# Altium integrated library Weidmueller_OMNIMATE_Signal.IntLib: 2550 symbols (part 13 of 45)
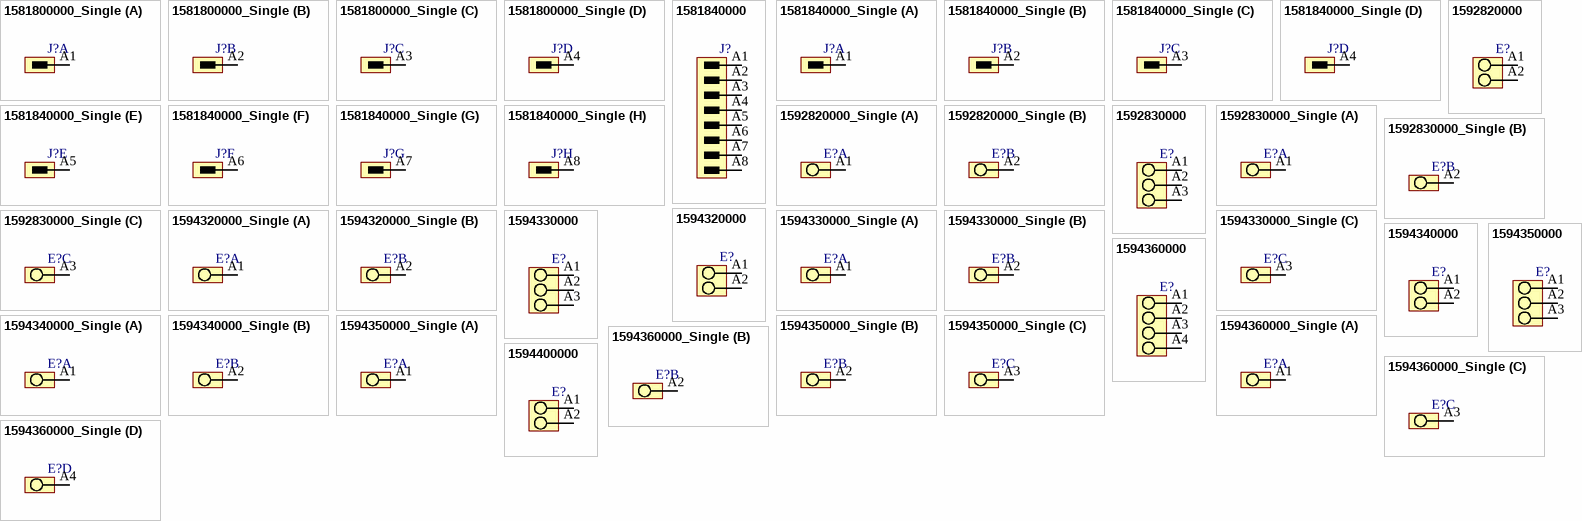
[diagram p223: symbols 1581800000_Single to 1594400000]

## 1594330000_Single
designator E?
OMNIMATE Signal - series LP; PartNumber: 1594330000; Manufacturer: Weidmueller; Short_text_for_material: LP 5.00/03/90 3.2SN OR BX; Side_termination_characteristic: closed side; Mounting_onto_the_PCB: Solder connection; Pitch_mm: 5 mm; Pitch_inch: 0,197 inch; No_of_poles: 3; Solder_pin_length_mm: 3,2 mm; Contact_material: Cu-Leg; Contact_surface: tinned; Insulating_material: PA; UL_94_flammability_rating: V-2; Rated_voltage_for_surge_voltage_class_pollution_degree_II_2: 500 V; Rated_current_min_no_of_poles_TU_20_deg_C: 32 A; Solid_min_H05_07_V_U: 0,5 mm²; Solid_max_H05_07_V_U: 6 mm²; Rated_voltage_use_group_B_UL_1059: 300 V; Rated_current_use_group_B_UL_1059: 20 A; Wire_cross_section_AWG_min_UL_1059: AWG 26; Wire_cross_section_AWG_max_UL_1059: AWG 12; PackageReference: LP_5_00_90_03; Colour: Orange; Packaging: Box; Qty: 100 PCS; Revision: V1; ComponentLink1Description: Manufacturer URL; ComponentLink1URL: http://www.weidmueller.com/; ComponentLink2Description: URL Link1; ComponentLink2URL: http://catalog.weidmueller.com/catalog/Start.do?localeId=en&ObjectID=1594330000
footprint LP_5_00_90_03 (OMNIMATE Signal - Serie LP  LP 5.00/03/90 3.2)
part A pins: A1
part B pins: A2
part C pins: A3
1 alternate drawing of the same symbol

## 1594340000
designator E?
OMNIMATE Signal - series LP; PartNumber: 1594340000; Manufacturer: Weidmueller; Short_text_for_material: LPP 5.00/02/90 3.2SN OR BX; Side_termination_characteristic: closed side; Mounting_onto_the_PCB: Solder connection; Pitch_mm: 5 mm; Pitch_inch: 0,197 inch; No_of_poles: 2; Solder_pin_length_mm: 3,2 mm; Contact_material: Cu-Leg; Contact_surface: tinned; Insulating_material: PA; UL_94_flammability_rating: V-2; Rated_voltage_for_surge_voltage_class_pollution_degree_II_2: 500 V; Rated_current_min_no_of_poles_TU_20_deg_C: 32 A; Solid_min_H05_07_V_U: 0,5 mm²; Solid_max_H05_07_V_U: 6 mm²; Rated_voltage_use_group_B_UL_1059: 300 V; Rated_current_use_group_B_UL_1059: 20 A; Wire_cross_section_AWG_min_UL_1059: AWG 26; Wire_cross_section_AWG_max_UL_1059: AWG 12; PackageReference: LPP_5_00_90_02; Colour: Orange; Packaging: Box; Qty: 100 PCS; Revision: V1; ComponentLink1Description: Manufacturer URL; ComponentLink1URL: http://www.weidmueller.com/; ComponentLink2Description: URL Link1; ComponentLink2URL: http://catalog.weidmueller.com/catalog/Start.do?localeId=en&ObjectID=1594340000
footprint LPP_5_00_90_02 (OMNIMATE Signal - Serie LP  LPP 5.00/02/90 3.2)
pins: A1, A2
1 alternate drawing of the same symbol

## 1594340000_Single
designator E?
OMNIMATE Signal - series LP; PartNumber: 1594340000; Manufacturer: Weidmueller; Short_text_for_material: LPP 5.00/02/90 3.2SN OR BX; Side_termination_characteristic: closed side; Mounting_onto_the_PCB: Solder connection; Pitch_mm: 5 mm; Pitch_inch: 0,197 inch; No_of_poles: 2; Solder_pin_length_mm: 3,2 mm; Contact_material: Cu-Leg; Contact_surface: tinned; Insulating_material: PA; UL_94_flammability_rating: V-2; Rated_voltage_for_surge_voltage_class_pollution_degree_II_2: 500 V; Rated_current_min_no_of_poles_TU_20_deg_C: 32 A; Solid_min_H05_07_V_U: 0,5 mm²; Solid_max_H05_07_V_U: 6 mm²; Rated_voltage_use_group_B_UL_1059: 300 V; Rated_current_use_group_B_UL_1059: 20 A; Wire_cross_section_AWG_min_UL_1059: AWG 26; Wire_cross_section_AWG_max_UL_1059: AWG 12; PackageReference: LPP_5_00_90_02; Colour: Orange; Packaging: Box; Qty: 100 PCS; Revision: V1; ComponentLink1Description: Manufacturer URL; ComponentLink1URL: http://www.weidmueller.com/; ComponentLink2Description: URL Link1; ComponentLink2URL: http://catalog.weidmueller.com/catalog/Start.do?localeId=en&ObjectID=1594340000
footprint LPP_5_00_90_02 (OMNIMATE Signal - Serie LP  LPP 5.00/02/90 3.2)
part A pins: A1
part B pins: A2
1 alternate drawing of the same symbol

## 1594350000
designator E?
OMNIMATE Signal - series LP; PartNumber: 1594350000; Manufacturer: Weidmueller; Short_text_for_material: LPP 5.00/03/90 3.2SN OR BX; Side_termination_characteristic: closed side; Mounting_onto_the_PCB: Solder connection; Pitch_mm: 5 mm; Pitch_inch: 0,197 inch; No_of_poles: 3; Solder_pin_length_mm: 3,2 mm; Contact_material: Cu-Leg; Contact_surface: tinned; Insulating_material: PA; UL_94_flammability_rating: V-2; Rated_voltage_for_surge_voltage_class_pollution_degree_II_2: 500 V; Rated_current_min_no_of_poles_TU_20_deg_C: 32 A; Solid_min_H05_07_V_U: 0,5 mm²; Solid_max_H05_07_V_U: 6 mm²; Rated_voltage_use_group_B_UL_1059: 300 V; Rated_current_use_group_B_UL_1059: 20 A; Wire_cross_section_AWG_min_UL_1059: AWG 26; Wire_cross_section_AWG_max_UL_1059: AWG 12; PackageReference: LPP_5_00_90_03; Colour: Orange; Packaging: Box; Qty: 100 PCS; Revision: V1; ComponentLink1Description: Manufacturer URL; ComponentLink1URL: http://www.weidmueller.com/; ComponentLink2Description: URL Link1; ComponentLink2URL: http://catalog.weidmueller.com/catalog/Start.do?localeId=en&ObjectID=1594350000
footprint LPP_5_00_90_03 (OMNIMATE Signal - Serie LP  LPP 5.00/03/90 3.2)
pins: A1, A2, A3
1 alternate drawing of the same symbol

## 1594350000_Single
designator E?
OMNIMATE Signal - series LP; PartNumber: 1594350000; Manufacturer: Weidmueller; Short_text_for_material: LPP 5.00/03/90 3.2SN OR BX; Side_termination_characteristic: closed side; Mounting_onto_the_PCB: Solder connection; Pitch_mm: 5 mm; Pitch_inch: 0,197 inch; No_of_poles: 3; Solder_pin_length_mm: 3,2 mm; Contact_material: Cu-Leg; Contact_surface: tinned; Insulating_material: PA; UL_94_flammability_rating: V-2; Rated_voltage_for_surge_voltage_class_pollution_degree_II_2: 500 V; Rated_current_min_no_of_poles_TU_20_deg_C: 32 A; Solid_min_H05_07_V_U: 0,5 mm²; Solid_max_H05_07_V_U: 6 mm²; Rated_voltage_use_group_B_UL_1059: 300 V; Rated_current_use_group_B_UL_1059: 20 A; Wire_cross_section_AWG_min_UL_1059: AWG 26; Wire_cross_section_AWG_max_UL_1059: AWG 12; PackageReference: LPP_5_00_90_03; Colour: Orange; Packaging: Box; Qty: 100 PCS; Revision: V1; ComponentLink1Description: Manufacturer URL; ComponentLink1URL: http://www.weidmueller.com/; ComponentLink2Description: URL Link1; ComponentLink2URL: http://catalog.weidmueller.com/catalog/Start.do?localeId=en&ObjectID=1594350000
footprint LPP_5_00_90_03 (OMNIMATE Signal - Serie LP  LPP 5.00/03/90 3.2)
part A pins: A1
part B pins: A2
part C pins: A3
1 alternate drawing of the same symbol

## 1594360000
designator E?
OMNIMATE Signal - series LP; PartNumber: 1594360000; Manufacturer: Weidmueller; Short_text_for_material: LP 5.08/04/90 3.2SN OR BX; Side_termination_characteristic: closed side; Mounting_onto_the_PCB: Solder connection; Pitch_mm: 5,08 mm; Pitch_inch: 0,2 inch; No_of_poles: 4; Solder_pin_length_mm: 3,2 mm; Contact_material: Cu-Leg; Contact_surface: tinned; Insulating_material: PA; UL_94_flammability_rating: V-2; Rated_voltage_for_surge_voltage_class_pollution_degree_II_2: 500 V; Rated_current_min_no_of_poles_TU_20_deg_C: 32 A; Solid_min_H05_07_V_U: 0,5 mm²; Solid_max_H05_07_V_U: 6 mm²; Rated_voltage_use_group_B_UL_1059: 300 V; Rated_current_use_group_B_UL_1059: 20 A; Wire_cross_section_AWG_min_UL_1059: AWG 26; Wire_cross_section_AWG_max_UL_1059: AWG 12; PackageReference: LP_5_08_90_04; Colour: Orange; Packaging: Box; Qty: 100 PCS; Revision: V1; ComponentLink1Description: Manufacturer URL; ComponentLink1URL: http://www.weidmueller.com/; ComponentLink2Description: URL Link1; ComponentLink2URL: http://catalog.weidmueller.com/catalog/Start.do?localeId=en&ObjectID=1594360000
footprint LP_5_08_90_04 (OMNIMATE Signal - Serie LP  LP 5.08/04/90 3.2)
pins: A1, A2, A3, A4
1 alternate drawing of the same symbol

## 1594360000_Single
designator E?
OMNIMATE Signal - series LP; PartNumber: 1594360000; Manufacturer: Weidmueller; Short_text_for_material: LP 5.08/04/90 3.2SN OR BX; Side_termination_characteristic: closed side; Mounting_onto_the_PCB: Solder connection; Pitch_mm: 5,08 mm; Pitch_inch: 0,2 inch; No_of_poles: 4; Solder_pin_length_mm: 3,2 mm; Contact_material: Cu-Leg; Contact_surface: tinned; Insulating_material: PA; UL_94_flammability_rating: V-2; Rated_voltage_for_surge_voltage_class_pollution_degree_II_2: 500 V; Rated_current_min_no_of_poles_TU_20_deg_C: 32 A; Solid_min_H05_07_V_U: 0,5 mm²; Solid_max_H05_07_V_U: 6 mm²; Rated_voltage_use_group_B_UL_1059: 300 V; Rated_current_use_group_B_UL_1059: 20 A; Wire_cross_section_AWG_min_UL_1059: AWG 26; Wire_cross_section_AWG_max_UL_1059: AWG 12; PackageReference: LP_5_08_90_04; Colour: Orange; Packaging: Box; Qty: 100 PCS; Revision: V1; ComponentLink1Description: Manufacturer URL; ComponentLink1URL: http://www.weidmueller.com/; ComponentLink2Description: URL Link1; ComponentLink2URL: http://catalog.weidmueller.com/catalog/Start.do?localeId=en&ObjectID=1594360000
footprint LP_5_08_90_04 (OMNIMATE Signal - Serie LP  LP 5.08/04/90 3.2)
part A pins: A1
part B pins: A2
part C pins: A3
part D pins: A4
1 alternate drawing of the same symbol

## 1594400000
designator E?
OMNIMATE Signal - series LP; PartNumber: 1594400000; Manufacturer: Weidmueller; Short_text_for_material: LPP 5.08/02/90 3.2SN OR BX; Side_termination_characteristic: closed side; Mounting_onto_the_PCB: Solder connection; Pitch_mm: 5,08 mm; Pitch_inch: 0,2 inch; No_of_poles: 2; Solder_pin_length_mm: 3,2 mm; Contact_material: Cu-Leg; Contact_surface: tinned; Insulating_material: PA; UL_94_flammability_rating: V-2; Rated_voltage_for_surge_voltage_class_pollution_degree_II_2: 500 V; Rated_current_min_no_of_poles_TU_20_deg_C: 32 A; Solid_min_H05_07_V_U: 0,5 mm²; Solid_max_H05_07_V_U: 6 mm²; Rated_voltage_use_group_B_UL_1059: 300 V; Rated_current_use_group_B_UL_1059: 20 A; Wire_cross_section_AWG_min_UL_1059: AWG 26; Wire_cross_section_AWG_max_UL_1059: AWG 12; PackageReference: LPP_5_08_90_02; Colour: Orange; Packaging: Box; Qty: 100 PCS; Revision: V1; ComponentLink1Description: Manufacturer URL; ComponentLink1URL: http://www.weidmueller.com/; ComponentLink2Description: URL Link1; ComponentLink2URL: http://catalog.weidmueller.com/catalog/Start.do?localeId=en&ObjectID=1594400000
footprint LPP_5_08_90_02 (OMNIMATE Signal - Serie LP  LPP 5.08/02/90 3.2)
pins: A1, A2
1 alternate drawing of the same symbol

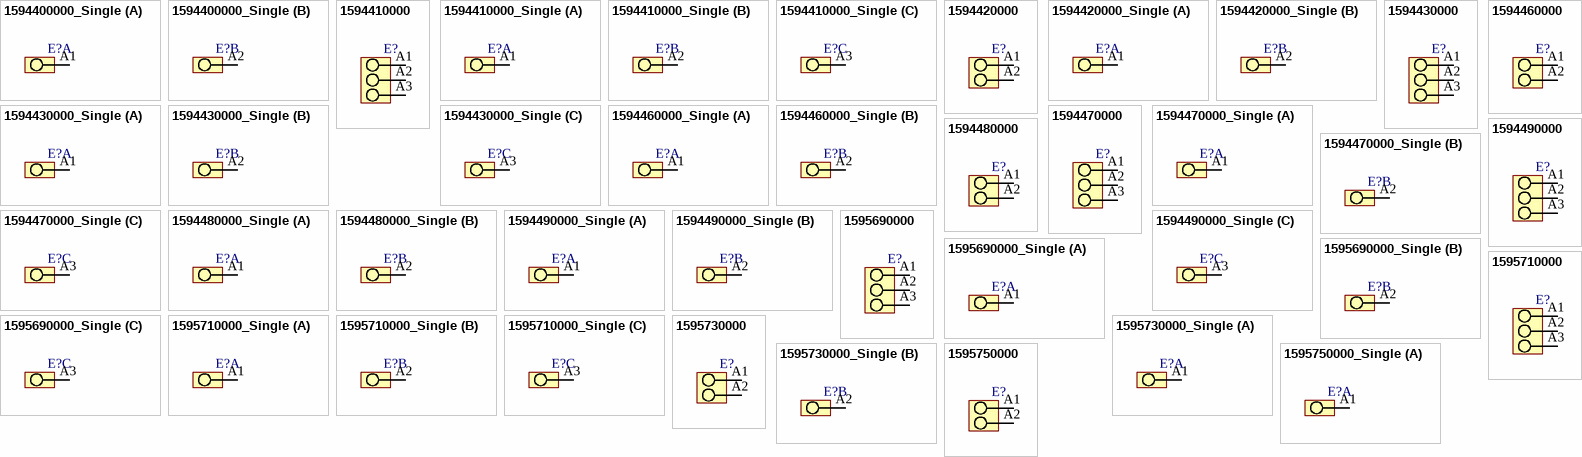
[diagram p74: symbols 1594400000_Single to 1595750000_Single]

## 1594400000_Single
designator E?
OMNIMATE Signal - series LP; PartNumber: 1594400000; Manufacturer: Weidmueller; Short_text_for_material: LPP 5.08/02/90 3.2SN OR BX; Side_termination_characteristic: closed side; Mounting_onto_the_PCB: Solder connection; Pitch_mm: 5,08 mm; Pitch_inch: 0,2 inch; No_of_poles: 2; Solder_pin_length_mm: 3,2 mm; Contact_material: Cu-Leg; Contact_surface: tinned; Insulating_material: PA; UL_94_flammability_rating: V-2; Rated_voltage_for_surge_voltage_class_pollution_degree_II_2: 500 V; Rated_current_min_no_of_poles_TU_20_deg_C: 32 A; Solid_min_H05_07_V_U: 0,5 mm²; Solid_max_H05_07_V_U: 6 mm²; Rated_voltage_use_group_B_UL_1059: 300 V; Rated_current_use_group_B_UL_1059: 20 A; Wire_cross_section_AWG_min_UL_1059: AWG 26; Wire_cross_section_AWG_max_UL_1059: AWG 12; PackageReference: LPP_5_08_90_02; Colour: Orange; Packaging: Box; Qty: 100 PCS; Revision: V1; ComponentLink1Description: Manufacturer URL; ComponentLink1URL: http://www.weidmueller.com/; ComponentLink2Description: URL Link1; ComponentLink2URL: http://catalog.weidmueller.com/catalog/Start.do?localeId=en&ObjectID=1594400000
footprint LPP_5_08_90_02 (OMNIMATE Signal - Serie LP  LPP 5.08/02/90 3.2)
part A pins: A1
part B pins: A2
1 alternate drawing of the same symbol

## 1594410000
designator E?
OMNIMATE Signal - series LP; PartNumber: 1594410000; Manufacturer: Weidmueller; Short_text_for_material: LPP 5.08/03/90 3.2SN OR BX; Side_termination_characteristic: closed side; Mounting_onto_the_PCB: Solder connection; Pitch_mm: 5,08 mm; Pitch_inch: 0,2 inch; No_of_poles: 3; Solder_pin_length_mm: 3,2 mm; Contact_material: Cu-Leg; Contact_surface: tinned; Insulating_material: PA; UL_94_flammability_rating: V-2; Rated_voltage_for_surge_voltage_class_pollution_degree_II_2: 500 V; Rated_current_min_no_of_poles_TU_20_deg_C: 32 A; Solid_min_H05_07_V_U: 0,5 mm²; Solid_max_H05_07_V_U: 6 mm²; Rated_voltage_use_group_B_UL_1059: 300 V; Rated_current_use_group_B_UL_1059: 20 A; Wire_cross_section_AWG_min_UL_1059: AWG 26; Wire_cross_section_AWG_max_UL_1059: AWG 12; PackageReference: LPP_5_08_90_03; Colour: Orange; Packaging: Box; Qty: 100 PCS; Revision: V1; ComponentLink1Description: Manufacturer URL; ComponentLink1URL: http://www.weidmueller.com/; ComponentLink2Description: URL Link1; ComponentLink2URL: http://catalog.weidmueller.com/catalog/Start.do?localeId=en&ObjectID=1594410000
footprint LPP_5_08_90_03 (OMNIMATE Signal - Serie LP  LPP 5.08/03/90 3.2)
pins: A1, A2, A3
1 alternate drawing of the same symbol

## 1594410000_Single
designator E?
OMNIMATE Signal - series LP; PartNumber: 1594410000; Manufacturer: Weidmueller; Short_text_for_material: LPP 5.08/03/90 3.2SN OR BX; Side_termination_characteristic: closed side; Mounting_onto_the_PCB: Solder connection; Pitch_mm: 5,08 mm; Pitch_inch: 0,2 inch; No_of_poles: 3; Solder_pin_length_mm: 3,2 mm; Contact_material: Cu-Leg; Contact_surface: tinned; Insulating_material: PA; UL_94_flammability_rating: V-2; Rated_voltage_for_surge_voltage_class_pollution_degree_II_2: 500 V; Rated_current_min_no_of_poles_TU_20_deg_C: 32 A; Solid_min_H05_07_V_U: 0,5 mm²; Solid_max_H05_07_V_U: 6 mm²; Rated_voltage_use_group_B_UL_1059: 300 V; Rated_current_use_group_B_UL_1059: 20 A; Wire_cross_section_AWG_min_UL_1059: AWG 26; Wire_cross_section_AWG_max_UL_1059: AWG 12; PackageReference: LPP_5_08_90_03; Colour: Orange; Packaging: Box; Qty: 100 PCS; Revision: V1; ComponentLink1Description: Manufacturer URL; ComponentLink1URL: http://www.weidmueller.com/; ComponentLink2Description: URL Link1; ComponentLink2URL: http://catalog.weidmueller.com/catalog/Start.do?localeId=en&ObjectID=1594410000
footprint LPP_5_08_90_03 (OMNIMATE Signal - Serie LP  LPP 5.08/03/90 3.2)
part A pins: A1
part B pins: A2
part C pins: A3
1 alternate drawing of the same symbol

## 1594420000
designator E?
OMNIMATE Signal - series LP; PartNumber: 1594420000; Manufacturer: Weidmueller; Short_text_for_material: LP 7.50/02/90 3.2SN OR BX; Side_termination_characteristic: closed side; Mounting_onto_the_PCB: Solder connection; Pitch_mm: 7,5 mm; Pitch_inch: 0,295 inch; No_of_poles: 2; Solder_pin_length_mm: 3,2 mm; Contact_material: Cu-Leg; Contact_surface: tinned; Insulating_material: PA; UL_94_flammability_rating: V-2; Rated_voltage_for_surge_voltage_class_pollution_degree_II_2: 1000 V; Rated_current_min_no_of_poles_TU_20_deg_C: 32 A; Solid_min_H05_07_V_U: 0,5 mm²; Solid_max_H05_07_V_U: 6 mm²; Rated_voltage_use_group_B_UL_1059: 300 V; Rated_current_use_group_B_UL_1059: 20 A; Wire_cross_section_AWG_min_UL_1059: AWG 26; Wire_cross_section_AWG_max_UL_1059: AWG 12; PackageReference: LP_7_5_90_02; Colour: Orange; Packaging: Box; Qty: 100 PCS; Revision: V1; ComponentLink1Description: Manufacturer URL; ComponentLink1URL: http://www.weidmueller.com/; ComponentLink2Description: URL Link1; ComponentLink2URL: http://catalog.weidmueller.com/catalog/Start.do?localeId=en&ObjectID=1594420000
footprint LP_7_5_90_02 (OMNIMATE Signal - Serie LP  LP 7.50/02/90 3.2)
pins: A1, A2
1 alternate drawing of the same symbol

## 1594420000_Single
designator E?
OMNIMATE Signal - series LP; PartNumber: 1594420000; Manufacturer: Weidmueller; Short_text_for_material: LP 7.50/02/90 3.2SN OR BX; Side_termination_characteristic: closed side; Mounting_onto_the_PCB: Solder connection; Pitch_mm: 7,5 mm; Pitch_inch: 0,295 inch; No_of_poles: 2; Solder_pin_length_mm: 3,2 mm; Contact_material: Cu-Leg; Contact_surface: tinned; Insulating_material: PA; UL_94_flammability_rating: V-2; Rated_voltage_for_surge_voltage_class_pollution_degree_II_2: 1000 V; Rated_current_min_no_of_poles_TU_20_deg_C: 32 A; Solid_min_H05_07_V_U: 0,5 mm²; Solid_max_H05_07_V_U: 6 mm²; Rated_voltage_use_group_B_UL_1059: 300 V; Rated_current_use_group_B_UL_1059: 20 A; Wire_cross_section_AWG_min_UL_1059: AWG 26; Wire_cross_section_AWG_max_UL_1059: AWG 12; PackageReference: LP_7_5_90_02; Colour: Orange; Packaging: Box; Qty: 100 PCS; Revision: V1; ComponentLink1Description: Manufacturer URL; ComponentLink1URL: http://www.weidmueller.com/; ComponentLink2Description: URL Link1; ComponentLink2URL: http://catalog.weidmueller.com/catalog/Start.do?localeId=en&ObjectID=1594420000
footprint LP_7_5_90_02 (OMNIMATE Signal - Serie LP  LP 7.50/02/90 3.2)
part A pins: A1
part B pins: A2
1 alternate drawing of the same symbol

## 1594430000
designator E?
OMNIMATE Signal - series LP; PartNumber: 1594430000; Manufacturer: Weidmueller; Short_text_for_material: LP 7.50/03/90 3.2SN OR BX; Side_termination_characteristic: closed side; Mounting_onto_the_PCB: Solder connection; Pitch_mm: 7,5 mm; Pitch_inch: 0,295 inch; No_of_poles: 3; Solder_pin_length_mm: 3,2 mm; Contact_material: Cu-Leg; Contact_surface: tinned; Insulating_material: PA; UL_94_flammability_rating: V-2; Rated_voltage_for_surge_voltage_class_pollution_degree_II_2: 1000 V; Rated_current_min_no_of_poles_TU_20_deg_C: 32 A; Solid_min_H05_07_V_U: 0,5 mm²; Solid_max_H05_07_V_U: 6 mm²; Rated_voltage_use_group_B_UL_1059: 300 V; Rated_current_use_group_B_UL_1059: 20 A; Wire_cross_section_AWG_min_UL_1059: AWG 26; Wire_cross_section_AWG_max_UL_1059: AWG 12; PackageReference: LP_7_5_90_03; Colour: Orange; Packaging: Box; Qty: 100 PCS; Revision: V1; ComponentLink1Description: Manufacturer URL; ComponentLink1URL: http://www.weidmueller.com/; ComponentLink2Description: URL Link1; ComponentLink2URL: http://catalog.weidmueller.com/catalog/Start.do?localeId=en&ObjectID=1594430000
footprint LP_7_5_90_03 (OMNIMATE Signal - Serie LP  LP 7.50/03/90 3.2)
pins: A1, A2, A3
1 alternate drawing of the same symbol

## 1594430000_Single
designator E?
OMNIMATE Signal - series LP; PartNumber: 1594430000; Manufacturer: Weidmueller; Short_text_for_material: LP 7.50/03/90 3.2SN OR BX; Side_termination_characteristic: closed side; Mounting_onto_the_PCB: Solder connection; Pitch_mm: 7,5 mm; Pitch_inch: 0,295 inch; No_of_poles: 3; Solder_pin_length_mm: 3,2 mm; Contact_material: Cu-Leg; Contact_surface: tinned; Insulating_material: PA; UL_94_flammability_rating: V-2; Rated_voltage_for_surge_voltage_class_pollution_degree_II_2: 1000 V; Rated_current_min_no_of_poles_TU_20_deg_C: 32 A; Solid_min_H05_07_V_U: 0,5 mm²; Solid_max_H05_07_V_U: 6 mm²; Rated_voltage_use_group_B_UL_1059: 300 V; Rated_current_use_group_B_UL_1059: 20 A; Wire_cross_section_AWG_min_UL_1059: AWG 26; Wire_cross_section_AWG_max_UL_1059: AWG 12; PackageReference: LP_7_5_90_03; Colour: Orange; Packaging: Box; Qty: 100 PCS; Revision: V1; ComponentLink1Description: Manufacturer URL; ComponentLink1URL: http://www.weidmueller.com/; ComponentLink2Description: URL Link1; ComponentLink2URL: http://catalog.weidmueller.com/catalog/Start.do?localeId=en&ObjectID=1594430000
footprint LP_7_5_90_03 (OMNIMATE Signal - Serie LP  LP 7.50/03/90 3.2)
part A pins: A1
part B pins: A2
part C pins: A3
1 alternate drawing of the same symbol

## 1594460000
designator E?
OMNIMATE Signal - series LP; PartNumber: 1594460000; Manufacturer: Weidmueller; Short_text_for_material: LP 7.62/02/90 3.2SN OR BX; Side_termination_characteristic: closed side; Mounting_onto_the_PCB: Solder connection; Pitch_mm: 7,62 mm; Pitch_inch: 0,3 inch; No_of_poles: 2; Solder_pin_length_mm: 3,2 mm; Contact_material: Cu-Leg; Contact_surface: tinned; Insulating_material: PA; UL_94_flammability_rating: V-2; Rated_voltage_for_surge_voltage_class_pollution_degree_II_2: 1000 V; Rated_current_min_no_of_poles_TU_20_deg_C: 32 A; Solid_min_H05_07_V_U: 0,5 mm²; Solid_max_H05_07_V_U: 6 mm²; Rated_voltage_use_group_B_UL_1059: 300 V; Rated_current_use_group_B_UL_1059: 20 A; Wire_cross_section_AWG_min_UL_1059: AWG 26; Wire_cross_section_AWG_max_UL_1059: AWG 12; PackageReference: LP_7_62_90_02; Colour: Orange; Packaging: Box; Qty: 100 PCS; Revision: V1; ComponentLink1Description: Manufacturer URL; ComponentLink1URL: http://www.weidmueller.com/; ComponentLink2Description: URL Link1; ComponentLink2URL: http://catalog.weidmueller.com/catalog/Start.do?localeId=en&ObjectID=1594460000
footprint LP_7_62_90_02 (OMNIMATE Signal - Serie LP  LP 7.62/02/90 3.2)
pins: A1, A2
1 alternate drawing of the same symbol

## 1594460000_Single
designator E?
OMNIMATE Signal - series LP; PartNumber: 1594460000; Manufacturer: Weidmueller; Short_text_for_material: LP 7.62/02/90 3.2SN OR BX; Side_termination_characteristic: closed side; Mounting_onto_the_PCB: Solder connection; Pitch_mm: 7,62 mm; Pitch_inch: 0,3 inch; No_of_poles: 2; Solder_pin_length_mm: 3,2 mm; Contact_material: Cu-Leg; Contact_surface: tinned; Insulating_material: PA; UL_94_flammability_rating: V-2; Rated_voltage_for_surge_voltage_class_pollution_degree_II_2: 1000 V; Rated_current_min_no_of_poles_TU_20_deg_C: 32 A; Solid_min_H05_07_V_U: 0,5 mm²; Solid_max_H05_07_V_U: 6 mm²; Rated_voltage_use_group_B_UL_1059: 300 V; Rated_current_use_group_B_UL_1059: 20 A; Wire_cross_section_AWG_min_UL_1059: AWG 26; Wire_cross_section_AWG_max_UL_1059: AWG 12; PackageReference: LP_7_62_90_02; Colour: Orange; Packaging: Box; Qty: 100 PCS; Revision: V1; ComponentLink1Description: Manufacturer URL; ComponentLink1URL: http://www.weidmueller.com/; ComponentLink2Description: URL Link1; ComponentLink2URL: http://catalog.weidmueller.com/catalog/Start.do?localeId=en&ObjectID=1594460000
footprint LP_7_62_90_02 (OMNIMATE Signal - Serie LP  LP 7.62/02/90 3.2)
part A pins: A1
part B pins: A2
1 alternate drawing of the same symbol

## 1594470000
designator E?
OMNIMATE Signal - series LP; PartNumber: 1594470000; Manufacturer: Weidmueller; Short_text_for_material: LP 7.62/03/90 3.2SN OR BX; Side_termination_characteristic: closed side; Mounting_onto_the_PCB: Solder connection; Pitch_mm: 7,62 mm; Pitch_inch: 0,3 inch; No_of_poles: 3; Solder_pin_length_mm: 3,2 mm; Contact_material: Cu-Leg; Contact_surface: tinned; Insulating_material: PA; UL_94_flammability_rating: V-2; Rated_voltage_for_surge_voltage_class_pollution_degree_II_2: 1000 V; Rated_current_min_no_of_poles_TU_20_deg_C: 32 A; Solid_min_H05_07_V_U: 0,5 mm²; Solid_max_H05_07_V_U: 6 mm²; Rated_voltage_use_group_B_UL_1059: 300 V; Rated_current_use_group_B_UL_1059: 20 A; Wire_cross_section_AWG_min_UL_1059: AWG 26; Wire_cross_section_AWG_max_UL_1059: AWG 12; PackageReference: LP_7_62_90_03; Colour: Orange; Packaging: Box; Qty: 100 PCS; Revision: V1; ComponentLink1Description: Manufacturer URL; ComponentLink1URL: http://www.weidmueller.com/; ComponentLink2Description: URL Link1; ComponentLink2URL: http://catalog.weidmueller.com/catalog/Start.do?localeId=en&ObjectID=1594470000
footprint LP_7_62_90_03 (OMNIMATE Signal - Serie LP  LP 7.62/03/90 3.2)
pins: A1, A2, A3
1 alternate drawing of the same symbol

## 1594470000_Single
designator E?
OMNIMATE Signal - series LP; PartNumber: 1594470000; Manufacturer: Weidmueller; Short_text_for_material: LP 7.62/03/90 3.2SN OR BX; Side_termination_characteristic: closed side; Mounting_onto_the_PCB: Solder connection; Pitch_mm: 7,62 mm; Pitch_inch: 0,3 inch; No_of_poles: 3; Solder_pin_length_mm: 3,2 mm; Contact_material: Cu-Leg; Contact_surface: tinned; Insulating_material: PA; UL_94_flammability_rating: V-2; Rated_voltage_for_surge_voltage_class_pollution_degree_II_2: 1000 V; Rated_current_min_no_of_poles_TU_20_deg_C: 32 A; Solid_min_H05_07_V_U: 0,5 mm²; Solid_max_H05_07_V_U: 6 mm²; Rated_voltage_use_group_B_UL_1059: 300 V; Rated_current_use_group_B_UL_1059: 20 A; Wire_cross_section_AWG_min_UL_1059: AWG 26; Wire_cross_section_AWG_max_UL_1059: AWG 12; PackageReference: LP_7_62_90_03; Colour: Orange; Packaging: Box; Qty: 100 PCS; Revision: V1; ComponentLink1Description: Manufacturer URL; ComponentLink1URL: http://www.weidmueller.com/; ComponentLink2Description: URL Link1; ComponentLink2URL: http://catalog.weidmueller.com/catalog/Start.do?localeId=en&ObjectID=1594470000
footprint LP_7_62_90_03 (OMNIMATE Signal - Serie LP  LP 7.62/03/90 3.2)
part A pins: A1
part B pins: A2
part C pins: A3
1 alternate drawing of the same symbol

## 1594480000
designator E?
OMNIMATE Signal - series LP; PartNumber: 1594480000; Manufacturer: Weidmueller; Short_text_for_material: LPP 7.62/02/90 3.2SN OR BX; Side_termination_characteristic: closed side; Mounting_onto_the_PCB: Solder connection; Pitch_mm: 7,62 mm; Pitch_inch: 0,3 inch; No_of_poles: 2; Solder_pin_length_mm: 3,2 mm; Contact_material: Cu-Leg; Contact_surface: tinned; Insulating_material: PA; UL_94_flammability_rating: V-2; Rated_voltage_for_surge_voltage_class_pollution_degree_II_2: 1000 V; Rated_current_min_no_of_poles_TU_20_deg_C: 32 A; Solid_min_H05_07_V_U: 0,5 mm²; Solid_max_H05_07_V_U: 6 mm²; Rated_voltage_use_group_B_UL_1059: 300 V; Rated_current_use_group_B_UL_1059: 20 A; Wire_cross_section_AWG_min_UL_1059: AWG 26; Wire_cross_section_AWG_max_UL_1059: AWG 12; PackageReference: LPP_7_62_90_02; Colour: Orange; Packaging: Box; Qty: 100 PCS; Revision: V1; ComponentLink1Description: Manufacturer URL; ComponentLink1URL: http://www.weidmueller.com/; ComponentLink2Description: URL Link1; ComponentLink2URL: http://catalog.weidmueller.com/catalog/Start.do?localeId=en&ObjectID=1594480000
footprint LPP_7_62_90_02 (OMNIMATE Signal - Serie LP  LPP 7.62/02/90 3.2)
pins: A1, A2
1 alternate drawing of the same symbol

## 1594480000_Single
designator E?
OMNIMATE Signal - series LP; PartNumber: 1594480000; Manufacturer: Weidmueller; Short_text_for_material: LPP 7.62/02/90 3.2SN OR BX; Side_termination_characteristic: closed side; Mounting_onto_the_PCB: Solder connection; Pitch_mm: 7,62 mm; Pitch_inch: 0,3 inch; No_of_poles: 2; Solder_pin_length_mm: 3,2 mm; Contact_material: Cu-Leg; Contact_surface: tinned; Insulating_material: PA; UL_94_flammability_rating: V-2; Rated_voltage_for_surge_voltage_class_pollution_degree_II_2: 1000 V; Rated_current_min_no_of_poles_TU_20_deg_C: 32 A; Solid_min_H05_07_V_U: 0,5 mm²; Solid_max_H05_07_V_U: 6 mm²; Rated_voltage_use_group_B_UL_1059: 300 V; Rated_current_use_group_B_UL_1059: 20 A; Wire_cross_section_AWG_min_UL_1059: AWG 26; Wire_cross_section_AWG_max_UL_1059: AWG 12; PackageReference: LPP_7_62_90_02; Colour: Orange; Packaging: Box; Qty: 100 PCS; Revision: V1; ComponentLink1Description: Manufacturer URL; ComponentLink1URL: http://www.weidmueller.com/; ComponentLink2Description: URL Link1; ComponentLink2URL: http://catalog.weidmueller.com/catalog/Start.do?localeId=en&ObjectID=1594480000
footprint LPP_7_62_90_02 (OMNIMATE Signal - Serie LP  LPP 7.62/02/90 3.2)
part A pins: A1
part B pins: A2
1 alternate drawing of the same symbol

## 1594490000
designator E?
OMNIMATE Signal - series LP; PartNumber: 1594490000; Manufacturer: Weidmueller; Short_text_for_material: LPP 7.62/03/90 3.2SN OR BX; Side_termination_characteristic: closed side; Mounting_onto_the_PCB: Solder connection; Pitch_mm: 7,62 mm; Pitch_inch: 0,3 inch; No_of_poles: 3; Solder_pin_length_mm: 3,2 mm; Contact_material: Cu-Leg; Contact_surface: tinned; Insulating_material: PA; UL_94_flammability_rating: V-2; Rated_voltage_for_surge_voltage_class_pollution_degree_II_2: 1000 V; Rated_current_min_no_of_poles_TU_20_deg_C: 32 A; Solid_min_H05_07_V_U: 0,5 mm²; Solid_max_H05_07_V_U: 6 mm²; Rated_voltage_use_group_B_UL_1059: 300 V; Rated_current_use_group_B_UL_1059: 20 A; Wire_cross_section_AWG_min_UL_1059: AWG 26; Wire_cross_section_AWG_max_UL_1059: AWG 12; PackageReference: LPP_7_62_90_03; Colour: Orange; Packaging: Box; Qty: 100 PCS; Revision: V1; ComponentLink1Description: Manufacturer URL; ComponentLink1URL: http://www.weidmueller.com/; ComponentLink2Description: URL Link1; ComponentLink2URL: http://catalog.weidmueller.com/catalog/Start.do?localeId=en&ObjectID=1594490000
footprint LPP_7_62_90_03 (OMNIMATE Signal - Serie LP  LPP 7.62/03/90 3.2)
pins: A1, A2, A3
1 alternate drawing of the same symbol

## 1594490000_Single
designator E?
OMNIMATE Signal - series LP; PartNumber: 1594490000; Manufacturer: Weidmueller; Short_text_for_material: LPP 7.62/03/90 3.2SN OR BX; Side_termination_characteristic: closed side; Mounting_onto_the_PCB: Solder connection; Pitch_mm: 7,62 mm; Pitch_inch: 0,3 inch; No_of_poles: 3; Solder_pin_length_mm: 3,2 mm; Contact_material: Cu-Leg; Contact_surface: tinned; Insulating_material: PA; UL_94_flammability_rating: V-2; Rated_voltage_for_surge_voltage_class_pollution_degree_II_2: 1000 V; Rated_current_min_no_of_poles_TU_20_deg_C: 32 A; Solid_min_H05_07_V_U: 0,5 mm²; Solid_max_H05_07_V_U: 6 mm²; Rated_voltage_use_group_B_UL_1059: 300 V; Rated_current_use_group_B_UL_1059: 20 A; Wire_cross_section_AWG_min_UL_1059: AWG 26; Wire_cross_section_AWG_max_UL_1059: AWG 12; PackageReference: LPP_7_62_90_03; Colour: Orange; Packaging: Box; Qty: 100 PCS; Revision: V1; ComponentLink1Description: Manufacturer URL; ComponentLink1URL: http://www.weidmueller.com/; ComponentLink2Description: URL Link1; ComponentLink2URL: http://catalog.weidmueller.com/catalog/Start.do?localeId=en&ObjectID=1594490000
footprint LPP_7_62_90_03 (OMNIMATE Signal - Serie LP  LPP 7.62/03/90 3.2)
part A pins: A1
part B pins: A2
part C pins: A3
1 alternate drawing of the same symbol

## 1595690000
designator E?
OMNIMATE Signal - series LP; PartNumber: 1595690000; Manufacturer: Weidmueller; Short_text_for_material: LP 5.08/03/135 3.2 OR; Side_termination_characteristic: closed side; Mounting_onto_the_PCB: Solder connection; Pitch_mm: 5,08 mm; Pitch_inch: 0,2 inch; No_of_poles: 3; Solder_pin_length_mm: 3,2 mm; Contact_material: Cu-Leg; Contact_surface: tinned; Insulating_material: PA; UL_94_flammability_rating: V-2; Rated_voltage_for_surge_voltage_class_pollution_degree_II_2: 500 V; Rated_current_min_no_of_poles_TU_20_deg_C: 32 A; Solid_min_H05_07_V_U: 0,5 mm²; Solid_max_H05_07_V_U: 6 mm²; Rated_voltage_use_group_B_UL_1059: 300 V; Rated_current_use_group_B_UL_1059: 20 A; Wire_cross_section_AWG_min_UL_1059: AWG 26; Wire_cross_section_AWG_max_UL_1059: AWG 12; PackageReference: LP_5_08_135_03; Colour: Orange; Packaging: Box; Qty: 100 PCS; Revision: V1; ComponentLink1Description: Manufacturer URL; ComponentLink1URL: http://www.weidmueller.com/; ComponentLink2Description: URL Link1; ComponentLink2URL: http://catalog.weidmueller.com/catalog/Start.do?localeId=en&ObjectID=1595690000
footprint LP_5_08_135_03 (OMNIMATE Signal - Serie LP  LP 5.08/03/135 3.2)
pins: A1, A2, A3
1 alternate drawing of the same symbol

## 1595690000_Single
designator E?
OMNIMATE Signal - series LP; PartNumber: 1595690000; Manufacturer: Weidmueller; Short_text_for_material: LP 5.08/03/135 3.2 OR; Side_termination_characteristic: closed side; Mounting_onto_the_PCB: Solder connection; Pitch_mm: 5,08 mm; Pitch_inch: 0,2 inch; No_of_poles: 3; Solder_pin_length_mm: 3,2 mm; Contact_material: Cu-Leg; Contact_surface: tinned; Insulating_material: PA; UL_94_flammability_rating: V-2; Rated_voltage_for_surge_voltage_class_pollution_degree_II_2: 500 V; Rated_current_min_no_of_poles_TU_20_deg_C: 32 A; Solid_min_H05_07_V_U: 0,5 mm²; Solid_max_H05_07_V_U: 6 mm²; Rated_voltage_use_group_B_UL_1059: 300 V; Rated_current_use_group_B_UL_1059: 20 A; Wire_cross_section_AWG_min_UL_1059: AWG 26; Wire_cross_section_AWG_max_UL_1059: AWG 12; PackageReference: LP_5_08_135_03; Colour: Orange; Packaging: Box; Qty: 100 PCS; Revision: V1; ComponentLink1Description: Manufacturer URL; ComponentLink1URL: http://www.weidmueller.com/; ComponentLink2Description: URL Link1; ComponentLink2URL: http://catalog.weidmueller.com/catalog/Start.do?localeId=en&ObjectID=1595690000
footprint LP_5_08_135_03 (OMNIMATE Signal - Serie LP  LP 5.08/03/135 3.2)
part A pins: A1
part B pins: A2
part C pins: A3
1 alternate drawing of the same symbol

## 1595710000
designator E?
OMNIMATE Signal - series LP; PartNumber: 1595710000; Manufacturer: Weidmueller; Short_text_for_material: LP5.00/3/135 3.2 OR; Side_termination_characteristic: closed side; Mounting_onto_the_PCB: Solder connection; Pitch_mm: 5 mm; Pitch_inch: 0,197 inch; No_of_poles: 3; Solder_pin_length_mm: 3,2 mm; Contact_material: Cu-Leg; Contact_surface: tinned; Insulating_material: PA; UL_94_flammability_rating: V-2; Rated_voltage_for_surge_voltage_class_pollution_degree_II_2: 500 V; Rated_current_min_no_of_poles_TU_20_deg_C: 32 A; Solid_min_H05_07_V_U: 0,5 mm²; Solid_max_H05_07_V_U: 6 mm²; Rated_voltage_use_group_B_UL_1059: 300 V; Rated_current_use_group_B_UL_1059: 20 A; Wire_cross_section_AWG_min_UL_1059: AWG 26; Wire_cross_section_AWG_max_UL_1059: AWG 12; PackageReference: LP_5_00_135_03; Colour: Orange; Packaging: Box; Qty: 100 PCS; Revision: V1; ComponentLink1Description: Manufacturer URL; ComponentLink1URL: http://www.weidmueller.com/; ComponentLink2Description: URL Link1; ComponentLink2URL: http://catalog.weidmueller.com/catalog/Start.do?localeId=en&ObjectID=1595710000
footprint LP_5_00_135_03 (OMNIMATE Signal - Serie LP  LP5.00/3/135 3.2)
pins: A1, A2, A3
1 alternate drawing of the same symbol

## 1595710000_Single
designator E?